# Altium footprint library Samtec PC104 Plus.PcbLib: 38 footprints (part 1 of 3)
Each footprint in its own frame and in the unit in brackets; x right, y up, seen from the top. Pads: shape width x height; smd on the part's side, far side on the other; paste and mask are expansions set on the pad; w line width, h text height; cw(c..) or ccw(c..) is an arc to the next point about the centre after c.
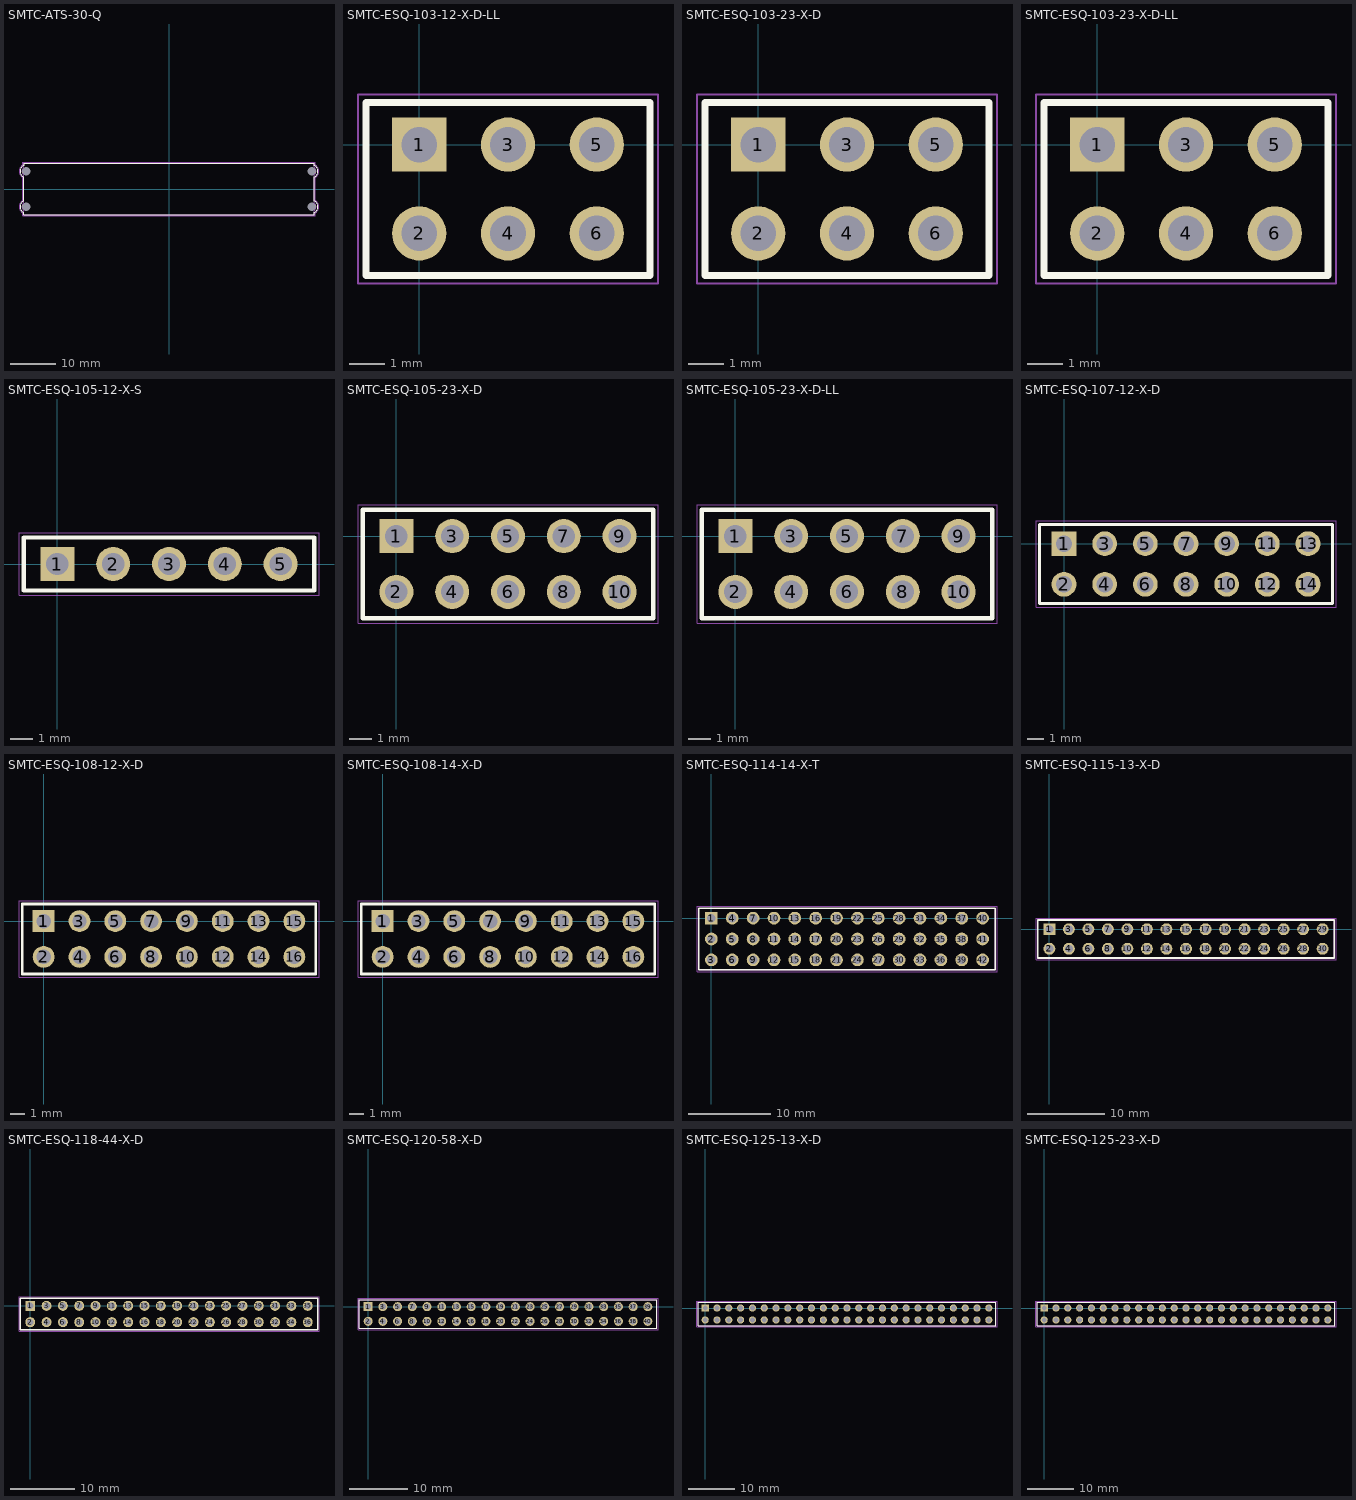
[diagram p0: the footprints below, top view; thin cyan lines are the x and y axes]

## SMTC-ATS-30-Q [mm] "Elevated SQT ASSM Shroud, 4x30 Holes, Vertical, 2mm Pitch, Female"
height 11.049
pads (4):
  round 1.605 hole 1.905 unplated: MH1(-31.674,-3.937) MH2(31.674,-3.937) MH3(31.674,3.937) MH4(-31.674,3.937)
Top Overlay:
  lines w0.2: -32.156,2.673 -32.156,-2.673 ccw(c-31.674,-3.937) -32.156,-5.201 -32.156,-5.715 32.156,-5.715 32.156,-5.201 ccw(c31.674,-3.937) 32.156,-2.673 32.156,2.673 ; -32.156,2.673 cw(c-31.674,3.937) -32.156,5.201 -32.156,5.715 32.156,5.715 32.156,5.201 cw(c31.674,3.937) 32.156,2.673
Mechanical 13:
  lines w0.1: -32.157,-4.758 cw(c-31.674,-3.937) -32.156,-3.115 -32.156,3.115 cw(c-31.674,3.937) -32.156,4.758 -32.156,5.715 32.157,5.715 32.156,4.758 cw(c31.674,3.937) 32.156,3.115 32.156,-3.115 cw(c31.674,-3.937) 32.157,-4.758 ; -32.156,-4.758 -32.156,-5.715 32.156,-5.715 32.156,-4.758
Mechanical 15:
  lines w0.05: -32.381,-5.94 32.381,-5.94 32.381,-5.348 ccw(c31.674,-3.937) 32.381,-2.526 32.381,2.526 ccw(c31.674,3.937) 32.381,5.348 32.381,5.94 -32.381,5.94 -32.381,5.348 ccw(c-31.674,3.937) -32.381,2.526 -32.381,-2.526 ccw(c-31.674,-3.937) -32.381,-5.348 -32.381,-5.94
3D body "ATS-30-Q.step": height 11.05, standoff -2.21, extent -32.804,-5.715 32.804,5.715

## SMTC-ESQ-103-12-X-D-LL [mm] "Elevated Socket, 2x3 Pins, Vertical, 2.54mm Pitch, Female"
height 11.303
pads (6):
  rect 1.55x1.55 hole 1.02: 1(0,0)
  round 1.55 hole 1.02: 2(0,-2.54) 3(2.54,0) 4(2.54,-2.54) 5(5.08,0) 6(5.08,-2.54)
Top Overlay:
  lines w0.2: -1.525,-3.745 -1.525,1.205 6.605,1.205 6.605,-3.745 -1.525,-3.745
Mechanical 13:
  lines w0.1: -1.525,-3.745 -1.525,1.205 6.605,1.205 6.605,-3.745 -1.525,-3.745
Mechanical 15:
  lines w0.05: -1.75,-3.97 -1.75,1.43 6.83,1.43 6.83,-3.97 -1.75,-3.97
3D body "ESQ-103-12-X-D-LL.step": height 11.3, standoff -2.29, extent -1.524,-3.81 6.604,1.27

## SMTC-ESQ-103-23-X-D [mm] "Elevated Socket, 2x3 Pins, Vertical, 2.54mm Pitch, Female"
height 13.843
pads (6):
  rect 1.55x1.55 hole 1.02: 1(0,0)
  round 1.55 hole 1.02: 2(0,-2.54) 3(2.54,0) 4(2.54,-2.54) 5(5.08,0) 6(5.08,-2.54)
Top Overlay:
  lines w0.2: -1.525,-3.745 6.605,-3.745 6.605,1.205 -1.525,1.205 -1.525,-3.745
Mechanical 13:
  lines w0.1: -1.525,-3.745 6.605,-3.745 6.605,1.205 -1.525,1.205 -1.525,-3.745
Mechanical 15:
  lines w0.05: -1.75,-3.97 6.83,-3.97 6.83,1.43 -1.75,1.43 -1.75,-3.97
3D body "ESQ-103-23-X-D.step": height 13.84, standoff -4.83, extent -1.524,-3.81 6.604,1.27

## SMTC-ESQ-103-23-X-D-LL [mm] "Elevated Socket, 2x3 Pins, Vertical, 2.54mm Pitch, Female"
height 13.843
pads (6):
  rect 1.55x1.55 hole 1.02: 1(0,0)
  round 1.55 hole 1.02: 2(0,-2.54) 3(2.54,0) 4(2.54,-2.54) 5(5.08,0) 6(5.08,-2.54)
Top Overlay:
  lines w0.2: -1.525,-3.745 6.605,-3.745 6.605,1.205 -1.525,1.205 -1.525,-3.745
Mechanical 13:
  lines w0.1: -1.525,-3.745 6.605,-3.745 6.605,1.205 -1.525,1.205 -1.525,-3.745
Mechanical 15:
  lines w0.05: -1.75,-3.97 6.83,-3.97 6.83,1.43 -1.75,1.43 -1.75,-3.97
3D body "ESQ-103-23-X-D-LL.step": height 13.84, standoff -4.83, extent -1.524,-3.81 6.604,1.27

## SMTC-ESQ-105-12-X-S [mm] "Elevated Socket, 1x5 Pins, Vertical, 2.54mm Pitch, Female"
height 11.303
pads (5):
  rect 1.55x1.55 hole 1.02: 1(0,0)
  round 1.55 hole 1.02: 2(2.54,0) 3(5.08,0) 4(7.62,0) 5(10.16,0)
Top Overlay:
  lines w0.2: -1.525,-1.205 -1.525,1.205 11.685,1.205 11.685,-1.205 -1.525,-1.205
Mechanical 13:
  lines w0.1: -1.525,-1.205 -1.525,1.205 11.685,1.205 11.685,-1.205 -1.525,-1.205
Mechanical 15:
  lines w0.05: -1.75,-1.43 11.91,-1.43 11.91,1.43 -1.75,1.43 -1.75,-1.43
3D body "ESQ-105-12-X-S.step": height 11.3, standoff -2.29, extent -1.524,-1.27 11.684,1.27

## SMTC-ESQ-105-23-X-D [mm] "Elevated Socket, 2x5 Pins, Vertical, 2.54mm Pitch, Female"
height 13.843
pads (10):
  rect 1.55x1.55 hole 1.02: 1(0,0)
  round 1.55 hole 1.02: 2(0,-2.54) 3(2.54,0) 4(2.54,-2.54) 5(5.08,0) 6(5.08,-2.54) 7(7.62,0) 8(7.62,-2.54) 9(10.16,0) 10(10.16,-2.54)
Top Overlay:
  lines w0.2: -1.525,-3.745 -1.525,1.205 11.685,1.205 11.685,-3.745 ; -1.524,-3.745 11.684,-3.745
Mechanical 13:
  lines w0.1: -1.525,-3.745 -1.525,1.205 11.685,1.205 11.685,-3.745 -1.525,-3.745
Mechanical 15:
  lines w0.05: -1.75,-3.97 -1.75,1.43 11.91,1.43 11.91,-3.97 -1.75,-3.97
3D body "ESQ-105-23-X-D.step": height 13.84, standoff -4.83, extent -1.524,-3.81 11.684,1.27

## SMTC-ESQ-105-23-X-D-LL [mm] "Elevated Socket, 2x5 Pins, Vertical, 2.54mm Pitch, Female"
height 13.843
pads (10):
  rect 1.55x1.55 hole 1.02: 1(0,0)
  round 1.55 hole 1.02: 2(0,-2.54) 3(2.54,0) 4(2.54,-2.54) 5(5.08,0) 6(5.08,-2.54) 7(7.62,0) 8(7.62,-2.54) 9(10.16,0) 10(10.16,-2.54)
Top Overlay:
  lines w0.2: -1.525,-3.745 11.685,-3.745 11.685,1.205 -1.525,1.205 -1.525,-3.745
Mechanical 13:
  lines w0.1: -1.525,-3.745 -1.525,1.205 11.685,1.205 11.685,-3.745 -1.525,-3.745
Mechanical 15:
  lines w0.05: -1.75,-3.97 -1.75,1.43 11.91,1.43 11.91,-3.97 -1.75,-3.97
3D body "ESQ-105-23-X-D-LL.step": height 13.84, standoff -4.83, extent -1.524,-3.81 11.684,1.27

## SMTC-ESQ-107-12-X-D [mm] "Elevated Socket, 2x7 Pins, Vertical, 2.54mm Pitch, Female"
height 11.303
pads (14):
  rect 1.55x1.55 hole 1.02: 1(0,0)
  round 1.55 hole 1.02: 2(0,-2.54) 3(2.54,0) 4(2.54,-2.54) 5(5.08,0) 6(5.08,-2.54) 7(7.62,0) 8(7.62,-2.54) 9(10.16,0) 10(10.16,-2.54) 11(12.7,0) 12(12.7,-2.54) 13(15.24,0) 14(15.24,-2.54)
Top Overlay:
  lines w0.2: -1.525,-3.745 16.765,-3.745 16.765,1.205 -1.525,1.205 -1.525,-3.745
Mechanical 13:
  lines w0.1: 16.765,1.202 16.765,-3.745 -1.525,-3.745 -1.525,1.205 16.765,1.205
Mechanical 15:
  lines w0.05: -1.75,-3.97 -1.75,1.43 16.99,1.43 16.99,-3.97 -1.75,-3.97
3D body "ESQ-107-12-X-D.step": height 11.3, standoff -2.29, extent -1.524,-3.81 16.764,1.27

## SMTC-ESQ-108-12-X-D [mm] "Elevated Socket, 2x8 Pins, Vertical, 2.54mm Pitch, Female"
height 11.303
pads (16):
  rect 1.55x1.55 hole 1.02: 1(0,0)
  round 1.55 hole 1.02: 2(0,-2.54) 3(2.54,0) 4(2.54,-2.54) 5(5.08,0) 6(5.08,-2.54) 7(7.62,0) 8(7.62,-2.54) 9(10.16,0) 10(10.16,-2.54) 11(12.7,0) 12(12.7,-2.54) 13(15.24,0) 14(15.24,-2.54) 15(17.78,0) 16(17.78,-2.54)
Top Overlay:
  lines w0.2: -1.525,-3.745 19.305,-3.745 19.305,1.205 -1.525,1.205 -1.525,-3.745
Mechanical 13:
  lines w0.1: -1.525,-3.745 19.305,-3.745 19.305,1.205 -1.525,1.205 -1.525,-3.745
Mechanical 15:
  lines w0.05: -1.75,-3.97 -1.75,1.43 19.53,1.43 19.53,-3.97 -1.75,-3.97
3D body "ESQ-108-12-X-D.step": height 11.3, standoff -2.29, extent -1.524,-3.81 19.304,1.27

## SMTC-ESQ-108-14-X-D [mm] "Elevated Socket, 2x8 Pins, Vertical, 2.54mm Pitch, Female"
height 11.303
pads (16):
  rect 1.55x1.55 hole 1.02: 1(0,0)
  round 1.55 hole 1.02: 2(0,-2.54) 3(2.54,0) 4(2.54,-2.54) 5(5.08,0) 6(5.08,-2.54) 7(7.62,0) 8(7.62,-2.54) 9(10.16,0) 10(10.16,-2.54) 11(12.7,0) 12(12.7,-2.54) 13(15.24,0) 14(15.24,-2.54) 15(17.78,0) 16(17.78,-2.54)
Top Overlay:
  lines w0.2: -1.525,-3.745 19.305,-3.745 19.305,1.205 -1.525,1.205 -1.525,-3.745
Mechanical 13:
  lines w0.1: -1.525,-3.745 19.305,-3.745 19.305,1.205 -1.525,1.205 -1.525,-3.745
Mechanical 15:
  lines w0.05: -1.75,-3.97 -1.75,1.43 19.53,1.43 19.53,-3.97 -1.75,-3.97
3D body "ESQ-108-14-X-D.step": height 11.3, standoff -12.19, extent -1.524,-3.81 19.304,1.27

## SMTC-ESQ-114-14-X-T [mm] "Elevated Socket, 3x14 Pins, Vertical, 2.54mm Pitch, Female"
height 11.303
pads (42):
  rect 1.55x1.55 hole 1.02: 1(0,0)
  round 1.55 hole 1.02: 2(0,-2.54) 3(0,-5.08) 4(2.54,0) 5(2.54,-2.54) 6(2.54,-5.08) 7(5.08,0) 8(5.08,-2.54) 9(5.08,-5.08) 10(7.62,0) 11(7.62,-2.54) 12(7.62,-5.08) 13(10.16,0) 14(10.16,-2.54) 15(10.16,-5.08) 16(12.7,0) 17(12.7,-2.54) 18(12.7,-5.08) 19(15.24,0) 20(15.24,-2.54) 21(15.24,-5.08) 22(17.78,0) 23(17.78,-2.54) 24(17.78,-5.08) 25(20.32,0) 26(20.32,-2.54) 27(20.32,-5.08) 28(22.86,0) 29(22.86,-2.54) 30(22.86,-5.08) 31(25.4,0) 32(25.4,-2.54) 33(25.4,-5.08) 34(27.94,0) 35(27.94,-2.54) 36(27.94,-5.08) 37(30.48,0) 38(30.48,-2.54) 39(30.48,-5.08) 40(33.02,0) 41(33.02,-2.54) 42(33.02,-5.08)
Top Overlay:
  lines w0.2: -1.525,-6.285 -1.525,1.205 34.545,1.205 34.545,-6.285 -1.525,-6.285
Mechanical 13:
  lines w0.1: -1.525,-6.285 -1.525,1.205 34.545,1.205 34.545,-6.285 -1.525,-6.285
Mechanical 15:
  lines w0.05: -1.75,-6.51 -1.75,1.43 34.77,1.43 34.77,-6.51 -1.75,-6.51
3D body "ESQ-114-14-X-T.step": height 11.3, standoff -12.19, extent -1.524,-6.35 34.544,1.27

## SMTC-ESQ-115-13-X-D [mm] "Elevated Socket, 2x15 Pins, Vertical, 2.54mm Pitch, Female"
height 11.303
pads (30):
  rect 1.55x1.55 hole 1.02: 1(0,0)
  round 1.55 hole 1.02: 2(0,-2.54) 3(2.54,0) 4(2.54,-2.54) 5(5.08,0) 6(5.08,-2.54) 7(7.62,0) 8(7.62,-2.54) 9(10.16,0) 10(10.16,-2.54) 11(12.7,0) 12(12.7,-2.54) 13(15.24,0) 14(15.24,-2.54) 15(17.78,0) 16(17.78,-2.54) 17(20.32,0) 18(20.32,-2.54) 19(22.86,0) 20(22.86,-2.54) 21(25.4,0) 22(25.4,-2.54) 23(27.94,0) 24(27.94,-2.54) 25(30.48,0) 26(30.48,-2.54) 27(33.02,0) 28(33.02,-2.54) 29(35.56,0) 30(35.56,-2.54)
Top Overlay:
  lines w0.2: -1.525,-3.745 -1.525,1.205 37.085,1.205 37.085,-3.745 -1.525,-3.745
Mechanical 13:
  lines w0.1: -1.525,-3.745 -1.525,1.205 37.085,1.205 37.085,-3.745 -1.525,-3.745
Mechanical 15:
  lines w0.05: -1.75,-3.97 -1.75,1.43 37.31,1.43 37.31,-3.97 -1.75,-3.97
3D body "ESQ-115-13-X-D.step": height 11.3, standoff -7.37, extent -1.525,-3.81 37.083,1.27

## SMTC-ESQ-118-44-X-D [mm] "Elevated Socket, 2x18 Pins, Vertical, 2.54mm Pitch, Female"
height 18.923
pads (36):
  rect 1.55x1.55 hole 1.02: 1(0,0)
  round 1.55 hole 1.02: 2(0,-2.54) 3(2.54,0) 4(2.54,-2.54) 5(5.08,0) 6(5.08,-2.54) 7(7.62,0) 8(7.62,-2.54) 9(10.16,0) 10(10.16,-2.54) 11(12.7,0) 12(12.7,-2.54) 13(15.24,0) 14(15.24,-2.54) 15(17.78,0) 16(17.78,-2.54) 17(20.32,0) 18(20.32,-2.54) 19(22.86,0) 20(22.86,-2.54) 21(25.4,0) 22(25.4,-2.54) 23(27.94,0) 24(27.94,-2.54) 25(30.48,0) 26(30.48,-2.54) 27(33.02,0) 28(33.02,-2.54) 29(35.56,0) 30(35.56,-2.54) 31(38.1,0) 32(38.1,-2.54) 33(40.64,0) 34(40.64,-2.54) 35(43.18,0) 36(43.18,-2.54)
Top Overlay:
  lines w0.2: -1.525,-3.745 -1.525,1.205 44.705,1.205 44.705,-3.745 -1.525,-3.745
Mechanical 13:
  lines w0.1: -1.525,-3.745 -1.525,1.205 44.705,1.205 44.705,-3.745 -1.525,-3.745
Mechanical 15:
  lines w0.05: -1.75,-3.97 44.93,-3.97 44.93,1.43 -1.75,1.43 -1.75,-3.97
3D body "ESQ-118-44-X-D.step": height 18.92, standoff -4.57, extent -1.524,-3.81 44.704,1.27

## SMTC-ESQ-120-58-X-D [mm] "Elevated Socket, 2x20 Pins, Vertical, 2.54mm Pitch, Female"
height 16.383
pads (40):
  rect 1.55x1.55 hole 1.02: 1(0,0)
  round 1.55 hole 1.02: 2(0,-2.54) 3(2.54,0) 4(2.54,-2.54) 5(5.08,0) 6(5.08,-2.54) 7(7.62,0) 8(7.62,-2.54) 9(10.16,0) 10(10.16,-2.54) 11(12.7,0) 12(12.7,-2.54) 13(15.24,0) 14(15.24,-2.54) 15(17.78,0) 16(17.78,-2.54) 17(20.32,0) 18(20.32,-2.54) 19(22.86,0) 20(22.86,-2.54) 21(25.4,0) 22(25.4,-2.54) 23(27.94,0) 24(27.94,-2.54) 25(30.48,0) 26(30.48,-2.54) 27(33.02,0) 28(33.02,-2.54) 29(35.56,0) 30(35.56,-2.54) 31(38.1,0) 32(38.1,-2.54) 33(40.64,0) 34(40.64,-2.54) 35(43.18,0) 36(43.18,-2.54) 37(45.72,0) 38(45.72,-2.54) 39(48.26,0) 40(48.26,-2.54)
Top Overlay:
  lines w0.2: -1.525,-3.745 -1.525,1.205 49.785,1.205 49.785,-3.745 -1.525,-3.745
Mechanical 13:
  lines w0.1: -1.525,-3.745 -1.525,1.205 49.785,1.205 49.785,-3.745 -1.525,-3.745
Mechanical 15:
  lines w0.05: -1.75,-3.97 50.01,-3.97 50.01,1.43 -1.75,1.43 -1.75,-3.97
3D body "ESQ-120-58-X-D.step": height 16.38, standoff -2.29, extent -1.524,-3.81 49.784,1.27

## SMTC-ESQ-125-13-X-D [mm] "Elevated Socket, 2x25 Pins, Vertical, 2.54mm Pitch, Female"
height 11.303
pads (50):
  rect 1.55x1.55 hole 1.02: 1(0,0)
  round 1.55 hole 1.02: 2(0,-2.54) 3(2.54,0) 4(2.54,-2.54) 5(5.08,0) 6(5.08,-2.54) 7(7.62,0) 8(7.62,-2.54) 9(10.16,0) 10(10.16,-2.54) 11(12.7,0) 12(12.7,-2.54) 13(15.24,0) 14(15.24,-2.54) 15(17.78,0) 16(17.78,-2.54) 17(20.32,0) 18(20.32,-2.54) 19(22.86,0) 20(22.86,-2.54) 21(25.4,0) 22(25.4,-2.54) 23(27.94,0) 24(27.94,-2.54) 25(30.48,0) 26(30.48,-2.54) 27(33.02,0) 28(33.02,-2.54) 29(35.56,0) 30(35.56,-2.54) 31(38.1,0) 32(38.1,-2.54) 33(40.64,0) 34(40.64,-2.54) 35(43.18,0) 36(43.18,-2.54) 37(45.72,0) 38(45.72,-2.54) 39(48.26,0) 40(48.26,-2.54) 41(50.8,0) 42(50.8,-2.54) 43(53.34,0) 44(53.34,-2.54) 45(55.88,0) 46(55.88,-2.54) 47(58.42,0) 48(58.42,-2.54) 49(60.96,0) 50(60.96,-2.54)
Top Overlay:
  lines w0.2: -1.525,-3.745 62.485,-3.745 62.485,1.205 -1.525,1.205 -1.525,-3.745
Mechanical 13:
  lines w0.1: -1.525,-3.745 62.485,-3.745 62.485,1.205 -1.525,1.205 -1.525,-3.745
Mechanical 15:
  lines w0.05: -1.75,-3.97 62.71,-3.97 62.71,1.43 -1.75,1.43 -1.75,-3.97
3D body "ESQ-125-13-X-D.step": height 11.3, standoff -7.37, extent -1.524,-3.81 62.484,1.27

## SMTC-ESQ-125-23-X-D [mm] "Elevated Socket, 2x25 Pins, Vertical, 2.54mm Pitch, Female"
height 13.843
pads (50):
  rect 1.55x1.55 hole 1.02: 1(0,0)
  round 1.55 hole 1.02: 2(0,-2.54) 3(2.54,0) 4(2.54,-2.54) 5(5.08,0) 6(5.08,-2.54) 7(7.62,0) 8(7.62,-2.54) 9(10.16,0) 10(10.16,-2.54) 11(12.7,0) 12(12.7,-2.54) 13(15.24,0) 14(15.24,-2.54) 15(17.78,0) 16(17.78,-2.54) 17(20.32,0) 18(20.32,-2.54) 19(22.86,0) 20(22.86,-2.54) 21(25.4,0) 22(25.4,-2.54) 23(27.94,0) 24(27.94,-2.54) 25(30.48,0) 26(30.48,-2.54) 27(33.02,0) 28(33.02,-2.54) 29(35.56,0) 30(35.56,-2.54) 31(38.1,0) 32(38.1,-2.54) 33(40.64,0) 34(40.64,-2.54) 35(43.18,0) 36(43.18,-2.54) 37(45.72,0) 38(45.72,-2.54) 39(48.26,0) 40(48.26,-2.54) 41(50.8,0) 42(50.8,-2.54) 43(53.34,0) 44(53.34,-2.54) 45(55.88,0) 46(55.88,-2.54) 47(58.42,0) 48(58.42,-2.54) 49(60.96,0) 50(60.96,-2.54)
Top Overlay:
  lines w0.2: -1.525,-3.745 62.485,-3.745 62.485,1.205 -1.525,1.205 -1.525,-3.745
Mechanical 13:
  lines w0.1: -1.525,-3.745 62.485,-3.745 62.485,1.205 -1.525,1.205 -1.525,-3.745
Mechanical 15:
  lines w0.05: -1.75,-3.97 62.71,-3.97 62.71,1.43 -1.75,1.43 -1.75,-3.97
3D body "ESQ-125-23-X-D.step": height 13.84, standoff -4.83, extent -1.524,-3.81 62.484,1.27